# Altium footprint library Footprints.PcbLib: 76 footprints (part 2 of 5)
Each footprint in its own frame and in the unit in brackets; x right, y up, seen from the top. Pads: shape width x height; smd on the part's side, far side on the other; paste and mask are expansions set on the pad; w line width, h text height; cw(c..) or ccw(c..) is an arc to the next point about the centre after c.
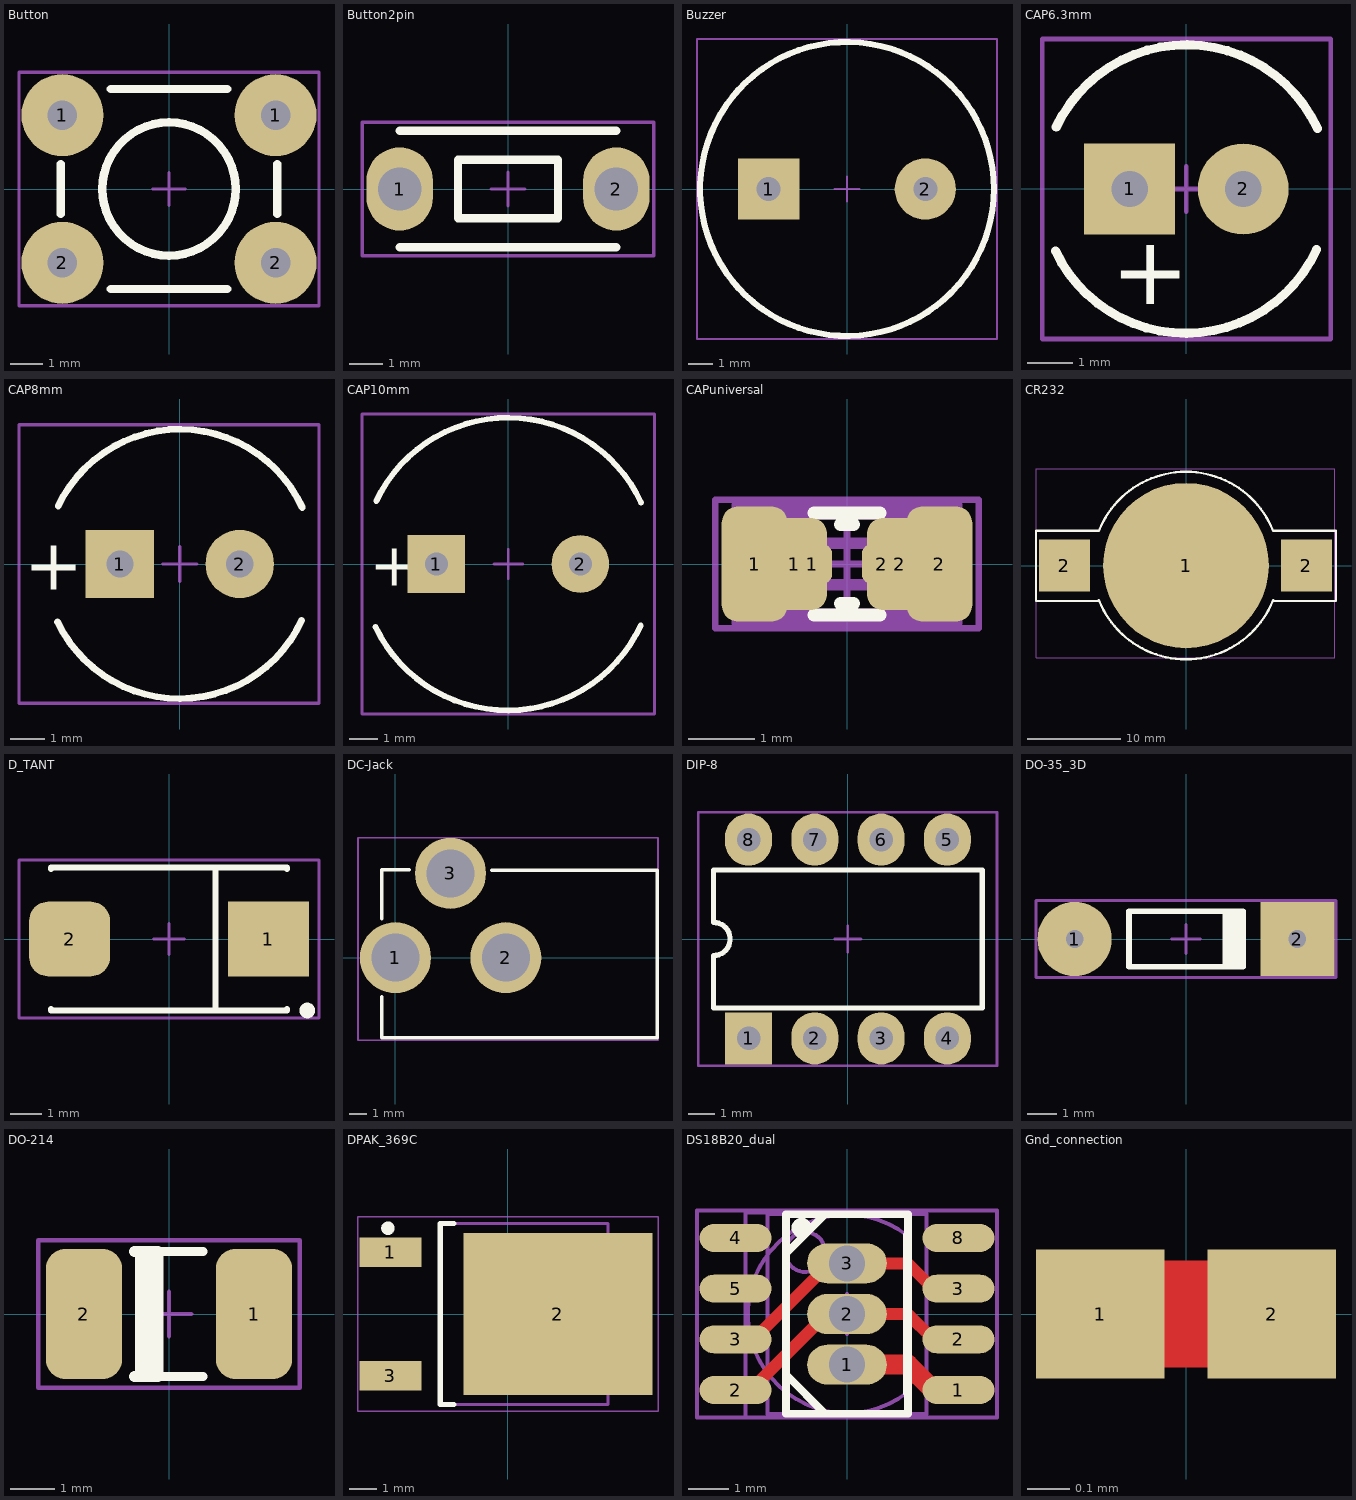
[diagram p1: the footprints below, top view; thin cyan lines are the x and y axes]

## Button [mm] "PushButton"
height 7
pads (4):
  round 2.5 hole 0.9 paste+0 mask+0: 1(-3.25,2.25) 1(3.25,2.25) 2(-3.25,-2.25) 2(3.25,-2.25)
Top Overlay:
  circle w0.254: c0,0 r2.032
  lines w0.254: -3.302,-0.762 -3.302,0.762 ; -1.778,-3.048 1.778,-3.048 ; -1.778,3.048 1.778,3.048 ; 3.302,-0.762 3.302,0.762
Mechanical 15:
  lines w0.1: -0.5,0 0.5,0 ; 0,-0.5 0,0.5 ; -4.572,-3.556 4.572,-3.556 4.572,3.556 -4.572,3.556 -4.572,-3.556
3D body "Pushbutton-3.step": height 7.4, standoff -3.5, extent -4.106,-3 4.106,3

## Button2pin [mm] "PushButton"
height 5
pads (2):
  oval 2x2.5 hole 1.3 paste+0 mask+0: 1(-3.25,0) 2(3.25,0)
Top Overlay:
  lines w0.25: -1.5,-0.875 -1.5,0 -1.5,0.875 0,0.875 1.5,0.875 1.5,0 1.5,-0.875 0,-0.875 -1.5,-0.875
  lines w0.254: -3.25,-1.75 3.25,-1.75 ; -3.25,1.75 3.25,1.75
Mechanical 15:
  lines w0.1: -0.5,0 0.5,0 ; 0,-0.5 0,0.5 ; -4.375,-2 -4.375,2 4.375,2 4.375,-2 -4.375,-2

## Buzzer [mm] "Buzzer"
height 10
pads (2):
  rect 2.54x2.54 hole 1: 1(-3.25,0)
  round 2.54 hole 1: 2(3.25,0)
Top Overlay:
  circle w0.254: c0,0 r6.096
Mechanical 15:
  lines w0.1: -0.5,0 0.5,0 ; 0,-0.5 0,0.5 ; -6.223,-6.223 -6.223,6.223 6.223,6.223 6.223,-6.223 -6.223,-6.223
3D body "User Library-Buzzer_Mini.step": height 8.6, standoff -5.4, extent -5.996,-5.982 6.004,6.018

## CAP6.3mm [mm] "Capacitor, Electrolytic, Radial; Body 6.3x12mm (Dia.xH typ); Pin Spacing 2.5mm"
height 12
pads (2):
  rect 2x2 hole 0.8: 1(-1.25,0)
  round 2 hole 0.8: 2(1.25,0)
Top Overlay:
  lines w0.2: -2.886,-1.364 ccw(c-0.017,0.002) 2.867,-1.332 ; -2.866,1.365 cw(c0,0) 2.881,1.333
  text "+" at -1.651,-2.54 h1.5
Mechanical 15:
  lines w0.1: -0.5,0 0.5,0 ; 0,-0.5 0,0.5 ; -3.175,-3.302 -3.175,3.302 3.175,3.302 3.175,-3.302 -3.175,-3.302
3D body "Cap electro 6_3x11x2_5mm.step": height 11.53, standoff -3.01, extent -3.175,-3.175 3.175,3.176

## CAP8mm [mm] "Capacitor, Electrolytic, Radial; Body 8x12mm (Dia.xH typ); Pin Spacing 3.5mm"
pads (2):
  rect 2x2 hole 0.8: 1(-1.75,0)
  round 2 hole 0.8: 2(1.75,0)
Top Overlay:
  lines w0.2: -3.571,-1.691 ccw(c-0.017,0.002) 3.556,-1.651 ; -3.554,1.693 cw(c0,0) 3.573,1.653
  text "+" at -4.55,-0.75 h1.5
Mechanical 15:
  lines w0.1: -0.5,0 0.5,0 ; 0,-0.5 0,0.5 ; -4.699,-4.064 4.064,-4.064 4.064,4.064 -4.699,4.064 -4.699,-4.064
3D body "CAPACITOR RADIAL 8X12.step": height 12, standoff -2.5, extent -4,-4 4,4

## CAP10mm [mm] "Capacitor, Electrolytic, Radial; Body 10x13mm (Dia.xH typ); Pin Spacing 5mm"
height 13
pads (2):
  rect 2x2 hole 0.8: 1(-2.5,0)
  round 2 hole 0.8: 2(2.5,0)
Top Overlay:
  lines w0.2: -4.607,-2.184 ccw(c-0.017,0.002) 4.597,-2.132 ; -4.586,2.184 cw(c0,0) 4.61,2.133
  text "+" at -4.804,-0.75 h1.5
Mechanical 15:
  lines w0.1: -0.5,0 0.5,0 ; 0,-0.5 0,0.5 ; -5.08,-5.207 -5.08,5.207 5.08,5.207 5.08,-5.207 -5.08,-5.207
3D body "CAPACITOR RADIAL 10x13.step": height 12.7, standoff -2.7, extent -5.039,-5.062 5.08,5.063

## CAPuniversal [mm] "Chip Capacitor, 2-Leads, All sizes"
height 1.5
pads (6):
  rrect50% 1x1.75 smd: 1(-1.4,0) 2(1.4,0)
  rrect50% 1x1.4 smd: 1(-0.8,0) 2(0.8,0)
  rrect50% 0.6x0.6 smd: 1(-0.525,0) 2(0.525,0)
Top Overlay:
  lines w0.2: -0.5,-0.775 0.5,-0.775 ; -0.5,0.775 0.5,0.775 ; -0.1,-0.6 0.1,-0.6 ; -0.1,0.6 0.1,0.6
Mechanical 13:
  lines w0.1: -1.7,-0.9 -1.7,0.9 1.7,0.9 1.7,-0.9 -1.7,-0.9 ; -1.105,-0.725 -1.105,0.725 1.105,0.725 1.105,-0.725 -1.105,-0.725 ; -0.55,-0.275 0.55,-0.275 0.55,0.275 -0.55,0.275 -0.55,-0.275
Mechanical 15:
  lines w0.1: -0.275,0 0.275,0 ; 0,-0.275 0,0.275 ; -2,-0.975 -2,0.975 2,0.975 2,-0.975 -2,-0.975 ; -1.425,-0.8 -1.425,0.8 1.425,0.8 1.425,-0.8 -1.425,-0.8 ; -0.925,-0.35 0.925,-0.35 0.925,0.35 -0.925,0.35 -0.925,-0.35 ; -0.5,0 0.5,0 -0.5,0 ; 0,-0.5 0,0.5 0,-0.5
3D body "1206 SMD Capacitor.step": height 1, standoff 0, extent -1.6,-0.8 1.6,0.8

## CR232 [mm] "Coin cell battery holder"
height 4
pads (3):
  round 17.8 smd: 1(0,0)
  rect 5.5x5.6 smd: 2(-13.081,0) 2(12.954,0)
Top Overlay:
  lines w0.254: -9.363,-3.81 -16.129,-3.81 -16.129,-3.048 -16.129,3.745 -9.363,3.745 cw(c0,0) 9.363,3.745 16.129,3.745 16.129,-3.048 16.129,-3.81 9.363,-3.81 ; -9.363,-3.745 ccw(c0,0) 9.363,-3.745
Mechanical 15:
  lines w0.1: -0.5,0 0.5,0 ; 0,-0.5 0,0.5 ; -16.129,-9.906 -16.129,10.414 16.002,10.414 16.002,-9.906 -16.129,-9.906
3D body "CR2032 PCB battery holder.step": height 3.96, standoff 0, extent -15.367,-9.8 15.367,10.27

## D_TANT [mm] "Capacitor, SM Tantalum; Body 7.3 x 4.3 mm (LxW typ)"
height 3.1
pads (2):
  rect 2.6x2.4 smd: 1(3.2,0)
  rrect50% 2.6x2.4 smd: 2(-3.2,0)
Top Overlay:
  circle w0.25: c4.45,-2.3 r0.125
  lines w0.2: -3.8,-2.25 -3.8,-2.3 3.8,-2.3 3.8,-2.25 ; -3.8,2.25 -3.8,2.3 3.8,2.3 3.8,2.25 ; 1.5,-2.3 1.5,2.3
Mechanical 15:
  lines w0.1: -0.5,0 0.5,0 ; 0,-0.5 0,0.5 ; -4.826,-2.54 -4.826,2.54 4.826,2.54 4.826,-2.54 -4.826,-2.54
3D body "User Library-CaseD_7343-31.step": height 2.8, standoff 0, extent -3.65,-2.15 3.65,2.15

## DC-Jack [mm] "DC Power Jack, 2.5mm, KLD Series, PCB Mount"
height 7
pads (3):
  round 4 hole 2.7 paste+0 mask+0: 1(0,0) 2(6.216,0) 3(3.099,4.75)
Top Overlay:
  lines w0.2: -0.762,-2.2 -0.762,-4.5 14.732,-4.5 14.732,4.928 5.416,4.928 ; -0.762,2.2 -0.762,4.953 0.762,4.953
Mechanical 15:
  lines w0.1: 6.231,0.229 7.231,0.229 ; 6.731,-0.271 6.731,0.729 ; -2.108,-4.648 -2.108,6.756 14.783,6.756 14.783,-4.648 -2.108,-4.648
3D body "User Library-Kobiconn_Lockable_DC_jack_161-0721-EX.step": height 11.1, standoff -3.4, extent -0.686,-4.475 14.614,4.881

## DIP-8 [mm] "DIP; 8 Leads; Row Spacing 7.62 mm; Pitch 2.54 mm"
height 5.08
pads (8):
  rect 1.8x2 hole 0.9: 1(-3.81,-3.81)
  oval 1.8x2 hole 0.9: 2(-1.27,-3.81) 3(1.27,-3.81) 4(3.81,-3.81) 5(3.81,3.81) 6(1.27,3.81) 7(-1.27,3.81) 8(-3.81,3.81)
Top Overlay:
  lines w0.2: -5.15,-2.65 5.15,-2.65 5.15,2.65 -5.15,2.65 -5.15,0.635 cw(c-5.15,0) -5.15,-0.635 -5.15,-2.65
Mechanical 15:
  lines w0.1: -0.5,0 0.5,0 ; 0,-0.5 0,0.5 ; -5.74,-4.851 5.715,-4.851 5.715,4.851 -5.74,4.851 -5.74,-4.851
3D body "CircuitWorks-DIP8.step": height 4.19, standoff -2.67, extent -5.715,-3.937 5.715,3.937

## DO-35_3D [mm] "Diode, Axial; Body 3.8 x 1.9 mm (LxDia. max), Lead Dia. 0.53 mm (max)"
height 1.9
pads (2):
  round 2.54 hole 0.6: 1(-3.81,0)
  rect 2.54x2.54 hole 0.6: 2(3.81,0)
Top Overlay:
  rectangle: 1.25,-0.95 2.05,0.95
  lines w0.2: 1.95,-0.95 -1.95,-0.95 -1.95,0.95 1.95,0.95
Mechanical 15:
  lines w0.1: -0.5,0 0.5,0 ; 0,-0.5 0,0.5 ; -5.131,-1.321 5.131,-1.321 5.131,1.321 -5.131,1.321 -5.131,-1.321
3D body "User Library-DO-204AH (DO-35).step": height 2.21, standoff -1.8, extent -4.07,-1.01 4.07,1.01

## DO-214 [mm]
height 1.8
pads (2):
  rrect50% 1.7x2.9 smd: 1(1.9,0) 2(-1.9,0)
Top Overlay:
  lines w0.2: -0.762,-1.397 0.762,-1.397 ; -0.762,1.397 0.762,1.397
  lines w0.254: -0.762,-1.397 -0.508,-1.397 ; -0.762,1.397 -0.508,1.397 ; -0.635,1.397 -0.635,-1.397 -0.508,-1.397 ; -0.508,-1.397 -0.508,-1.27 -0.508,1.397 ; -0.508,-1.397 -0.254,-1.397 -0.254,1.397 -0.508,1.397 ; -0.508,-1.397 -0.508,-1.397
Mechanical 15:
  lines w0.1: -0.5,0 0.5,0 ; 0,-0.5 0,0.5 ; -2.921,-1.651 2.921,-1.651 2.921,1.651 -2.921,1.651 -2.921,-1.651
3D body "DO-214AC SMA.step": height 2.4, standoff 0, extent -2.6,-1.3 2.6,1.3

## DPAK_369C [mm] "D-PAK, 4-Leads, Body 6.1x6.6mm, Pitch 2.29mm, Lead Span 9.7mm, IPC Medium Density"
height 2.38
pads (3):
  rect 2.3x1.1 smd: 1(-4.35,2.28) 3(-4.35,-2.28)
  rect 7x6 smd: 2(1.85,0)
Top Overlay:
  circle w0.25: c-4.443,3.175 r0.125
  lines w0.2: -2,-3.35 -2.5,-3.35 -2.5,3.35 -2,3.35
Mechanical 13:
  lines w0.1: -2.5,-3.35 3.7,-3.35 3.7,3.35 -2.5,3.35 -2.5,-3.35
Mechanical 15:
  lines w0.05: -5.55,-3.6 5.55,-3.6 5.55,3.6 -5.55,3.6 -5.55,-3.6
  lines w0.1: -0.5,0 0.5,0 ; 0,-0.5 0,0.5
3D body "DPAK 369A-13.step": height 2.4, standoff 0, extent -4.953,-3.3 5.147,3.3

## DS18B20_dual [mm] "SO8 with TO-92 overlayd"
height 10
pads (11):
  oval 2x1 hole 0.9: 1(0,-1.27) 2(0,0) 3(0,1.27)
  oval 1.8x0.7 smd: 1(2.794,-1.905) 2(-2.794,-1.905) 2(2.794,-0.635) 3(-2.794,-0.635) 3(2.794,0.635) 4(-2.794,1.905) 5(-2.794,0.635) 8(2.794,1.905)
Top Layer:
  lines w0.3: -2.794,-1.905 -2.413,-1.905 -0.508,0 0,0 1.524,0 2.159,-0.635 2.794,-0.635 ; -2.794,-0.635 -2.342,-0.635 -0.437,1.27 0,1.27 1.524,1.27 2.159,0.635 2.794,0.635
  lines w0.5: 0,-1.27 1.524,-1.27 2.159,-1.905 2.794,-1.905
Top Overlay:
  circle w0.25: c-1.141,2.159 r0.125
  lines w0.2: -1.524,-1.524 -0.548,-2.5 -0.508,-2.5 ; -1.524,1.524 -0.548,2.5 ; 1.5,-1.98 1.5,1.98 ; -1.524,-2.5 1.524,-2.5 1.524,2.5 -1.524,2.5 -1.524,-2.5
Mechanical 13:
  circle w0.1: c-1.045,1.55 r0.5
  lines w0.1: -1.995,-2.5 1.995,-2.5 1.995,2.5 -1.995,2.5 -1.995,-2.5 ; 1.5,-1.98 cw(c0,0) 1.5,1.98 1.5,-1.98
Mechanical 15:
  lines w0.1: -3.759,-2.591 3.759,-2.591 3.759,2.591 -3.759,2.591 -3.759,-2.591 ; -2.54,-2.591 1.549,-2.591 1.549,2.54 -2.54,2.54 -2.54,-2.591 ; -0.5,0 0.5,0 -0.5,0 ; 0,-0.5 0,0.5 0,-0.5
3D body "User Library-TO-92_Str.STEP": height 10, standoff -3, extent -2.613,-2.613 1.59,2.613
3D body "SOIC-8.step": height 1.75, standoff 0, extent -3,-2.45 3,2.45

## Gnd_connection [mm] "Different GND connect"
pads (2):
  rect 0.3x0.3 smd: 1(-0.2,0) 2(0.2,0)
Top Layer:
  rectangle: -0.2,-0.125 0.2,0.125